# Altium footprint library PCBLIB.PcbLib: 103 footprints (part 4 of 7)
Each footprint in its own frame and in the unit in brackets; x right, y up, seen from the top. Pads: shape width x height; smd on the part's side, far side on the other; paste and mask are expansions set on the pad; w line width, h text height; cw(c..) or ccw(c..) is an arc to the next point about the centre after c.
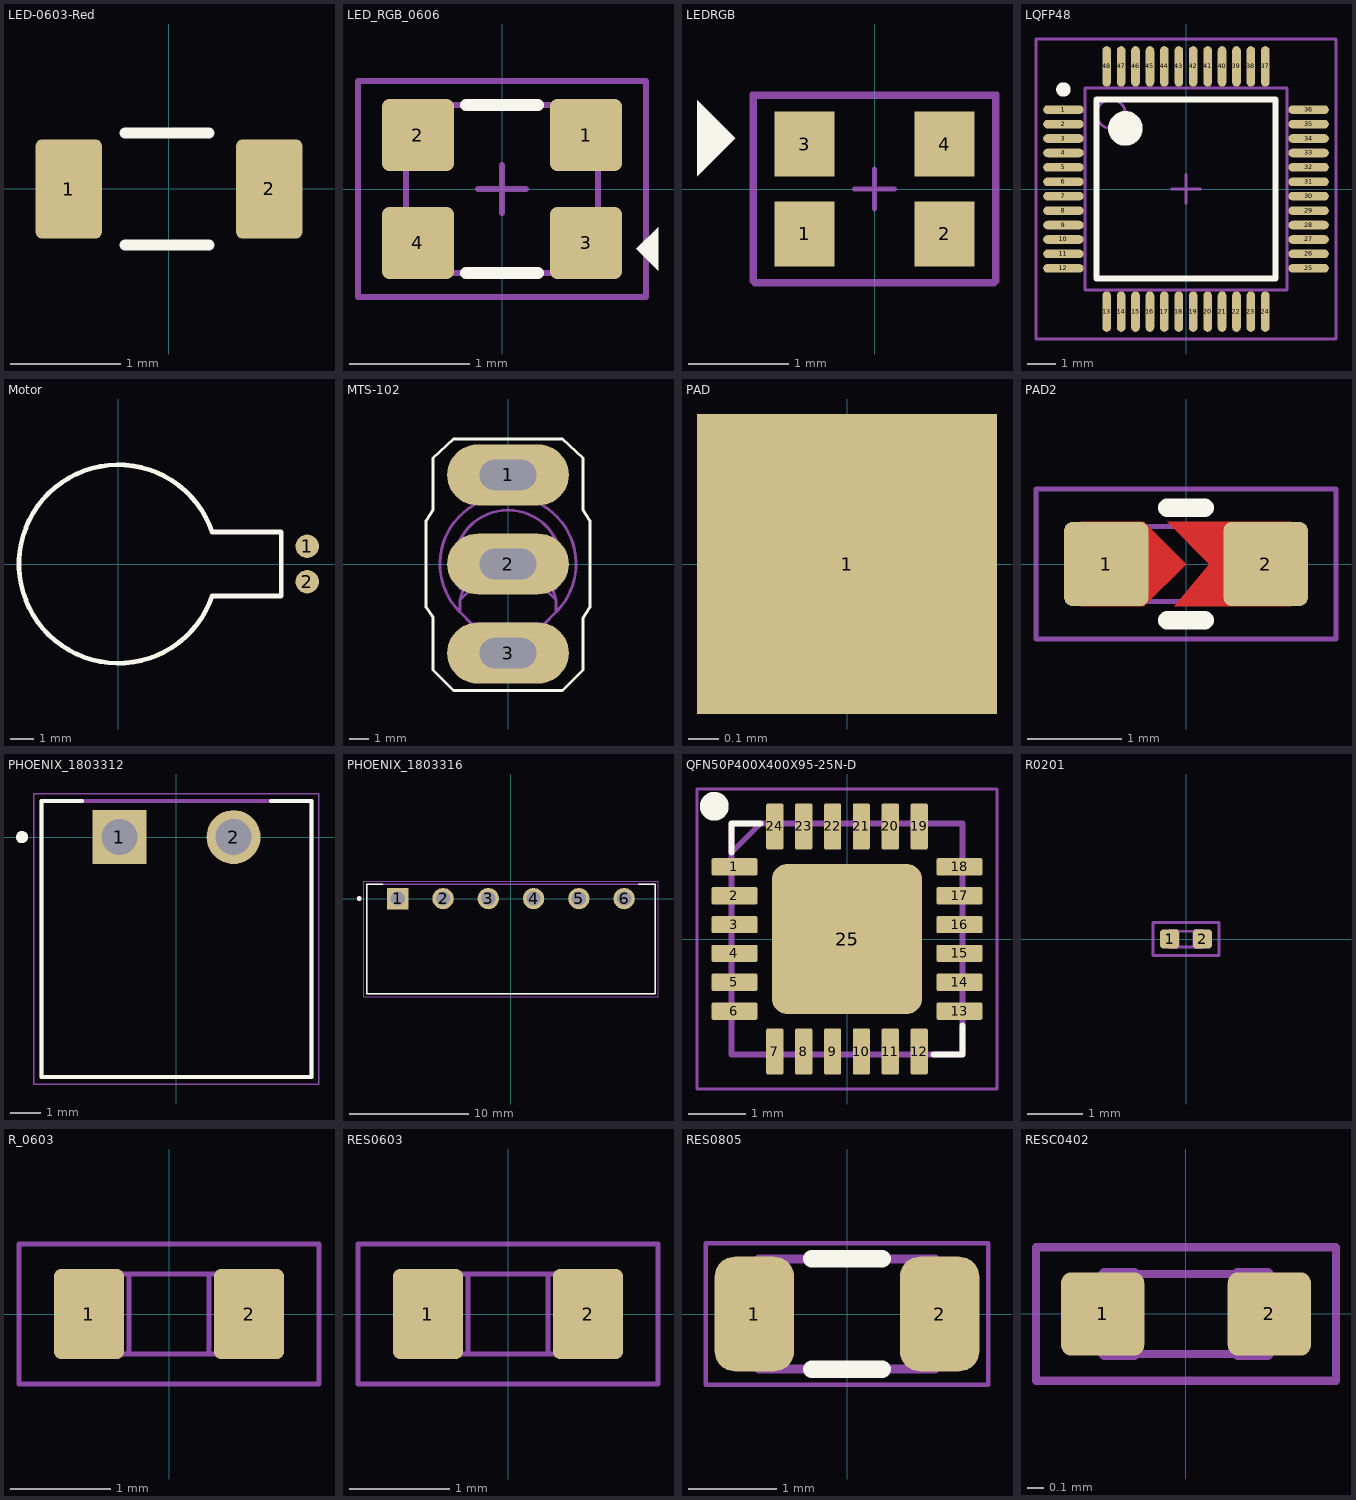
[diagram p3: the footprints below, top view; thin cyan lines are the x and y axes]

## LED-0603-Red [mm]
height 9
pads (2):
  rrect20% 0.6x0.9 smd mask+0.05: 1(-0.908,0) 2(0.908,0)
Top Overlay:
  lines w0.1: -0.4,-0.508 0.362,-0.508 ; -0.4,0.508 0.362,0.508
3D body "User Library-led_0805-red.step": height 1.1, standoff 0, extent -1.01,-0.625 1.01,0.625

## LED_RGB_0606 [mm]
height 0.55
pads (4):
  rrect20% 0.6x0.6 smd paste+0 mask+0.05: 1(0.7,0.45) 2(-0.7,0.45) 3(0.7,-0.45) 4(-0.7,-0.45)
Top Overlay:
  region: 1.119,-0.5 1.3,-0.681 1.3,-0.319
  lines w0.1: -0.3,-0.7 0.3,-0.7 ; -0.3,0.7 0.3,0.7
Top Component Outline:
  lines w0.05: -1.2,-0.9 1.2,-0.9 1.2,0.9 -1.2,0.9 -1.2,-0.9
Top Designator:
  text ".Designator" at 1.154,0.084 h0.4
Bottom Designator:
  text ".Designator" at -0.4,-0.2 h0.5
Mechanical 10:
  lines w0.05: -0.2,0 0.2,0 ; 0,-0.2 0,0.2 ; -0.8,-0.7 -0.8,0.7 0.8,0.7 0.8,-0.7 -0.8,-0.7
  text ".Designator" at 1.383,0.107 h0.5
3D body "LED_RGB_HSMF-C114.step": height 0.34, standoff -0.01, extent -0.8,-0.75 0.8,0.75

## LEDRGB [mm]
pads (4):
  rect 0.6x0.65 smd paste+0 mask+0.07: 1(-0.7,-0.45) 2(0.7,-0.45) 3(-0.7,0.45) 4(0.7,0.45)
Top Overlay:
  region: -1.397,0.508 -1.778,0.889 -1.778,0.127
Top Component Outline:
  lines w0.05: -1.225,-0.925 1.225,-0.925 1.225,0.95 -1.225,0.95 -1.225,-0.925
Top Designator:
  text ".Designator" at -1.154,-0.084 h0.4
Bottom Designator:
  text ".Designator" at 0.4,0.2 h0.5
Mechanical 10:
  lines w0.05: -0.2,0 0.2,0 ; 0,-0.2 0,0.2 ; -1.2,-0.95 1.2,-0.95 1.2,0.925 -1.2,0.925 -1.2,-0.95
  text ".Designator" at -1.383,-0.107 h0.5
3D body "LED_RGB_HSMF-C114.step": height 0.34, standoff -0.01, extent -0.8,-0.75 0.8,0.75

## LQFP48 [mm] "LQFP48_0P5x8P5"
pads (48):
  oval 1.4x0.3 smd mask+0.05: 1(-4.25,2.75) 2(-4.25,2.25) 3(-4.25,1.75) 4(-4.25,1.25) 5(-4.25,0.75) 6(-4.25,0.25) 7(-4.25,-0.25) 8(-4.25,-0.75) 9(-4.25,-1.25) 10(-4.25,-1.75) 11(-4.25,-2.25) 12(-4.25,-2.75) 25(4.25,-2.75) 26(4.25,-2.25) 27(4.25,-1.75) 28(4.25,-1.25) 29(4.25,-0.75) 30(4.25,-0.25) 31(4.25,0.25) 32(4.25,0.75) 33(4.25,1.25) 34(4.25,1.75) 35(4.25,2.25) 36(4.25,2.75)
  oval 0.3x1.4 smd mask+0.05: 13(-2.75,-4.25) 14(-2.25,-4.25) 15(-1.75,-4.25) 16(-1.25,-4.25) 17(-0.75,-4.25) 18(-0.25,-4.25) 19(0.25,-4.25) 20(0.75,-4.25) 21(1.25,-4.25) 22(1.75,-4.25) 23(2.25,-4.25) 24(2.75,-4.25) 37(2.75,4.25) 38(2.25,4.25) 39(1.75,4.25) 40(1.25,4.25) 41(0.75,4.25) 42(0.25,4.25) 43(-0.25,4.25) 44(-0.75,4.25) 45(-1.25,4.25) 46(-1.75,4.25) 47(-2.25,4.25) 48(-2.75,4.25)
Top Overlay:
  circle w0.6: c-2.1,2.1 r0.3
  circle w0.25: c-4.25,3.45 r0.125
  lines w0.2: -3.1,-3.1 3.1,-3.1 3.1,3.1 -3.1,3.1 -3.1,-3.1
Top Component Outline:
  lines w0.1: -0.5,0 0.5,0 ; 0,-0.5 0,0.5 ; -5.2,-5.2 -5.2,5.2 5.2,5.2 5.2,-5.2 -5.2,-5.2
Top Assembly:
  circle w0.1: c-2.6,2.6 r0.5
  lines w0.1: -3.5,-3.5 -3.5,3.5 3.5,3.5 3.5,-3.5 -3.5,-3.5
Top Designator:
  text ".Value" at 1.019,0.249 h0.8
3D body "TSQFP50P900X900X160-48N.step": height 1.6, standoff 0, extent -4.5,-4.5 4.5,4.5

## Motor [mm]
pads (2):
  round 1 smd: 1(8,0.75) 2(8,-0.75)
Top Overlay:
  lines w0.2: 3.979,-1.343 cw(c0,0) 3.979,1.343 ; 4,-1.35 6.9,-1.35 6.9,1.35 4,1.35
3D body: height 0.5, standoff 0, extent 0,-1.35 6.9,1.35
3D body: height 2.1, standoff 0, extent -4,-4 4,4

## MTS-102 [mm]
pads (3):
  oval 6.432x3.216 hole 1.6 slot 3 at 0 deg: 1(0,4.7) 2(0,0) 3(0,-4.7)
Top Overlay:
  lines w0.152: -4.318,-2.286 -3.95,-2.819 -3.95,-5.6 -2.87,-6.68 2.87,-6.68 3.95,-5.6 3.95,-2.87 4.318,-2.286 4.318,2.286 3.95,2.87 3.95,5.6 2.87,6.6 -2.87,6.6 -3.95,5.6 -3.95,2.87 -4.318,2.286 -4.318,-2.286
Bottom Courtyard:
  lines w0.152: -2.53,-1.289 cw(c0,0) 2.53,-1.289 ; -2.54,-2.54 cw(c0,0) 2.54,-2.54 ; -2.54,-2.54 -2.54,-1.905 ; -2.54,-2.54 -1.905,-3.175 1.905,-3.175 2.54,-2.54 ; -2.54,-1.905 -1.6,1.27 1.6,1.27 2.54,-1.905 ; -2.54,-1.905 -1.905,-1.27 1.905,-1.27 2.54,-1.905 ; 2.54,-2.54 2.54,-1.905
3D body "MTS-1xx-A1-blue.step": height 2.5, standoff -30.83, extent -6,-6.792 6,6.6

## PAD [mm]
pads (1):
  rect 1x1 smd: 1(0,0)

## PAD2 [mm]
pads (2):
  rrect20% 0.9x0.9 smd mask-1: 1(-0.85,0) 2(0.85,0)
Top Layer:
  region: 0.25,0 -0.2,0.45 1.125,0.45 1.125,-0.45 -0.125,-0.45
  region: 0,0 -0.45,0.45 -1.125,0.45 -1.125,-0.45 -0.45,-0.45
Top Overlay:
  lines w0.2: -0.2,-0.6 0.2,-0.6 ; -0.2,0.6 0.2,0.6
Top Solder:
  region: -1.2,0.45 -1.22,0.45 -1.257,0.435 -1.285,0.407 -1.3,0.37 -1.3,0.35 -1.3,-0.35 -1.3,-0.37 -1.285,-0.407 -1.257,-0.435 -1.22,-0.45 -1.2,-0.45 1.2,-0.45 1.22,-0.45 1.257,-0.435 1.285,-0.407 1.3,-0.37 1.3,-0.35 1.3,0.35 1.3,0.37 1.285,0.407 1.257,0.435 1.22,0.45 1.2,0.45
Top Component Center:
  text ".Comment 1" at -1.248,-0.098 h0.64
Top Component Outline:
  lines w0.05: -1.6,-0.8 1.6,-0.8 1.6,0.8 -1.6,0.8 -1.6,-0.8
Top Assembly:
  lines w0.05: -0.4,-0.4 -0.4,0.4 ; 0.4,-0.4 0.4,0.4 ; -0.8,-0.4 0.8,-0.4 0.8,0.4 -0.8,0.4 -0.8,-0.4
Top Designator:
  text ".Designator" at -1.237,-0.14 h0.64
3D body "RES0603.step": height 0.56, standoff 0, extent -0.85,-0.4 0.85,0.4

## PHOENIX_1803312 [mm]
pads (2):
  rect 1.8x1.8 hole 1.2: 1(-1.905,0)
  round 1.8 hole 1.2: 2(1.905,0)
Top Overlay:
  circle w0.2: c-5.155,0 r0.1
  lines w0.127: -3.155,1.2 -4.505,1.2 -4.505,-8 4.505,-8 4.505,1.2 3.155,1.2
Top Designator:
  text ".Value" at -1.307,-3.649 h0.8
Bottom Courtyard:
  circle w0.2: c-5.155,0 r0.1
  lines w0.127: -4.505,-8 -4.505,1.2 4.505,1.2 4.505,-8 -4.505,-8
Bottom 3D Body:
  lines w0.05: -4.755,-8.25 -4.755,1.45 4.755,1.45 4.755,-8.25 -4.755,-8.25
3D body "1803277.stp": height 7.25, standoff -3.4, extent -4.505,-8.1 4.505,1.194

## PHOENIX_1803316 [mm]
pads (6):
  rect 1.8x1.8 hole 1.2: 1(-9.525,0)
  round 1.8 hole 1.2: 2(-5.715,0) 3(-1.905,0) 4(1.905,0) 5(5.715,0) 6(9.525,0)
Top Overlay:
  circle w0.2: c-12.775,0 r0.1
  lines w0.127: -10.775,1.2 -12.125,1.2 -12.125,-8 12.125,-8 12.125,1.2 10.775,1.2
Top Designator:
  text ".Value" at -1.307,-3.649 h0.8
Bottom Courtyard:
  circle w0.2: c-12.775,0 r0.1
  lines w0.127: -12.125,-8 12.125,-8 12.125,1.2 -12.125,1.2 -12.125,-8
Bottom 3D Body:
  lines w0.05: -12.375,-8.25 -12.375,1.45 12.375,1.45 12.375,-8.25 -12.375,-8.25
3D body "1803316.stp": height 7.25, standoff -3.4, extent -12.125,-8 12.125,1.294

## QFN50P400X400X95-25N-D [mm]
height 0.6
pads (25):
  rrect20% 0.8x0.3 smd mask+0.05: 1(-1.95,1.25) 2(-1.95,0.75) 3(-1.95,0.25) 4(-1.95,-0.25) 5(-1.95,-0.75) 6(-1.95,-1.25) 13(1.95,-1.25) 14(1.95,-0.75) 15(1.95,-0.25) 16(1.95,0.25) 17(1.95,0.75) 18(1.95,1.25)
  rrect20% 0.3x0.8 smd mask+0.05: 7(-1.25,-1.95) 8(-0.75,-1.95) 9(-0.25,-1.95) 10(0.25,-1.95) 11(0.75,-1.95) 12(1.25,-1.95) 19(1.25,1.95) 20(0.75,1.95) 21(0.25,1.95) 22(-0.25,1.95) 23(-0.75,1.95) 24(-1.25,1.95)
  rrect20% 2.6x2.6 smd mask+0.05: 25(0,0)
Top Overlay:
  circle w0.25: c-2.3,2.3 r0.125
  lines w0.1: -2,1.5 -2,2 -1.5,2 ; 1.5,-2 2,-2 2,-1.5
Top Component Center:
  lines w0.05: -0.15,0 0.15,0 ; 0,-0.15 0,0.15
Top Component Outline:
  lines w0.05: -2.6,-2.6 2.6,-2.6 2.6,2.6 -2.6,2.6 -2.6,-2.6
Top Assembly:
  lines w0.1: -2,1.5 -1.5,2 ; -2,-2 2,-2 2,2 -2,2 -2,-2
  text ".Designator" at -1.578,-0.158 h0.7
3D body "ICM-20689.stp": height 0.95, standoff 0, extent -2.05,-2.05 2.05,2.05

## R0201 [mm] "R0201"
pads (2):
  rrect40% 0.35x0.35 smd mask+0.05: 1(-0.3,0) 2(0.3,0)
Top Overlay:
Top Component Outline:
  lines w0.05: -0.6,-0.3 -0.6,0.3 0.6,0.3 0.6,-0.3 -0.6,-0.3
Top Assembly:
  drawing of 22 lines, arcs and shapes, not listed
Top Designator:
  text ".Designator" at -0.451,-0.045 h0.2
Bottom Designator:
  text ".Comment" at -0.345,-0.062 h0.2
3D body "R_0201.step": height 0.34, standoff 0, extent -0.315,-0.165 0.365,0.165

## R_0603 [mm] "Resistor 0603"
pads (2):
  rrect20% 0.7x0.9 smd mask+0.1: 1(-0.8,0)
  rrect20% 0.7x0.9 smd: 2(0.8,0)
Top Component Center:
  text ".Comment 1" at -1.248,-0.098 h0.64
Top Component Outline:
  lines w0.05: -1.5,-0.7 -1.5,0.7 1.5,0.7 1.5,-0.7 -1.5,-0.7
Top Assembly:
  lines w0.05: -0.4,-0.4 -0.4,0.4 ; 0.4,-0.4 0.4,0.4 ; -0.8,-0.4 0.8,-0.4 0.8,0.4 -0.8,0.4 -0.8,-0.4
Top Designator:
  text ".Designator" at -1.237,-0.14 h0.64
3D body "RES0603.step": height 0.56, standoff 0, extent -0.85,-0.4 0.85,0.4

## RES0603 [mm] "Resistor 0603"
pads (2):
  rrect20% 0.7x0.9 smd mask+0.1: 1(-0.8,0)
  rrect20% 0.7x0.9 smd: 2(0.8,0)
Top Component Center:
  text ".Comment 1" at -1.248,-0.098 h0.64
Top Component Outline:
  lines w0.05: -1.5,-0.7 -1.5,0.7 1.5,0.7 1.5,-0.7 -1.5,-0.7
Top Assembly:
  lines w0.05: -0.4,-0.4 -0.4,0.4 ; 0.4,-0.4 0.4,0.4 ; -0.8,-0.4 0.8,-0.4 0.8,0.4 -0.8,0.4 -0.8,-0.4
Top Designator:
  text ".Designator" at -1.237,-0.14 h0.64
3D body "RES0603.step": height 0.56, standoff 0, extent -0.85,-0.4 0.85,0.4

## RES0805 [mm] "RES SMD 0805 ( 2012 Metric ) / https://www.seielect.com/catalog/sei-rmcf_rmcp.pdf"
height 4.3
pads (2):
  rrect50% 0.9x1.3 smd mask+0.05: 1(-1.05,0) 2(1.05,0)
Top Overlay:
  lines w0.2: -0.4,-0.625 0.4,-0.625 ; -0.4,0.625 0.4,0.625
Top Designator:
  text ".Designator" at 1.578,0.158 h0.7
Bottom Designator:
  text ".Comment" at -0.506,-0.2 h0.64
Mechanical 11:
  text ".Designator" at -0.506,-0.2 h0.64
Bottom Courtyard:
  region: -1,-0.625 -1,0.625 -0.7,0.625 -0.7,-0.625
  region: 0.7,-0.625 0.7,0.625 1,0.625 1,-0.625
  lines w0.1: -0.7,-0.525 -0.7,0.525 ; 0.7,-0.525 0.7,0.525 ; -0.7,-0.625 -0.7,0.625 ; -0.7,-0.625 0.7,-0.625 ; -0.7,-0.625 -0.72,-0.625 -0.74,-0.625 -1,-0.625 -1,0.625 -0.74,0.625 -0.72,0.625 -0.7,0.625 ; -0.7,0.625 0.7,0.625 ; 0.7,-0.625 0.7,0.625 ; 0.7,-0.625 0.72,-0.625 0.74,-0.625 1,-0.625 1,0.625 0.74,0.625 0.72,0.625 0.7,0.625
Bottom 3D Body:
  lines w0.05: -1.6,-0.8 1.6,-0.8 1.6,0.8 -1.6,0.8 -1.6,-0.8
3D body "RES0805.step": height 0.5, standoff 0, extent -1,-0.625 1,0.625

## RESC0402 [mm] "R0402"
pads (2):
  rrect25% 0.5x0.5 smd mask+0.05: 1(-0.5,0) 2(0.5,0)
Top Component Outline:
  lines w0.05: -0.9,-0.4 -0.9,0.4 0.9,0.4 0.9,-0.4 -0.9,-0.4
Top Assembly:
  region: -0.49,-0.25 -0.492,-0.25 -0.496,-0.248 -0.498,-0.246 -0.5,-0.242 -0.5,-0.24 -0.5,0.24 -0.5,0.242 -0.498,0.246 -0.496,0.248 -0.492,0.25 -0.49,0.25 -0.31,0.25 -0.308,0.25 -0.304,0.248 -0.302,0.246 -0.3,0.242 -0.3,0.24 -0.3,-0.24 -0.3,-0.242 -0.302,-0.246 -0.304,-0.248 -0.308,-0.25 -0.31,-0.25
  region: 0.3,-0.24 0.3,-0.242 0.302,-0.246 0.304,-0.248 0.308,-0.25 0.31,-0.25 0.49,-0.25 0.492,-0.25 0.496,-0.248 0.498,-0.246 0.5,-0.242 0.5,-0.24 0.5,0.24 0.5,0.242 0.498,0.246 0.496,0.248 0.492,0.25 0.49,0.25 0.31,0.25 0.308,0.25 0.304,0.248 0.302,0.246 0.3,0.242 0.3,0.24
  lines w0.05: -0.3,-0.24 cw(c-0.31,-0.24) -0.31,-0.25 -0.36,-0.25 -0.49,-0.25 cw(c-0.49,-0.24) -0.5,-0.24 -0.5,0.24 cw(c-0.49,0.24) -0.49,0.25 -0.36,0.25 -0.31,0.25 cw(c-0.31,0.24) -0.3,0.24 ; -0.3,-0.24 -0.3,0.24 ; -0.3,-0.24 0.3,-0.24 ; -0.3,0.24 0.3,0.24 ; 0.3,-0.24 ccw(c0.31,-0.24) 0.31,-0.25 0.36,-0.25 0.49,-0.25 ccw(c0.49,-0.24) 0.5,-0.24 0.5,0.24 ccw(c0.49,0.24) 0.49,0.25 0.36,0.25 0.31,0.25 ccw(c0.31,0.24) 0.3,0.24 ; 0.3,-0.24 0.3,0.24
Top Designator:
  text ".Designator" at -1.578,-0.158 h0.7
Bottom Designator:
  text ".Comment" at -0.5,-0.2 h0.64
Mechanical 11:
  text ".Designator" at -0.5,-0.2 h0.64
3D body "RES0402.step": height 0.35, standoff 0, extent -0.5,-0.25 0.5,0.25